# Altium footprint library LC-Standard-FootPrints-AD-V1.00工程师同事给的标准库（含3D）.PcbLib: 463 footprints (part 24 of 29)
Each footprint in its own frame and in the unit in brackets; x right, y up, seen from the top. Pads: shape width x height; smd on the part's side, far side on the other; paste and mask are expansions set on the pad; w line width, h text height; cw(c..) or ccw(c..) is an arc to the next point about the centre after c.
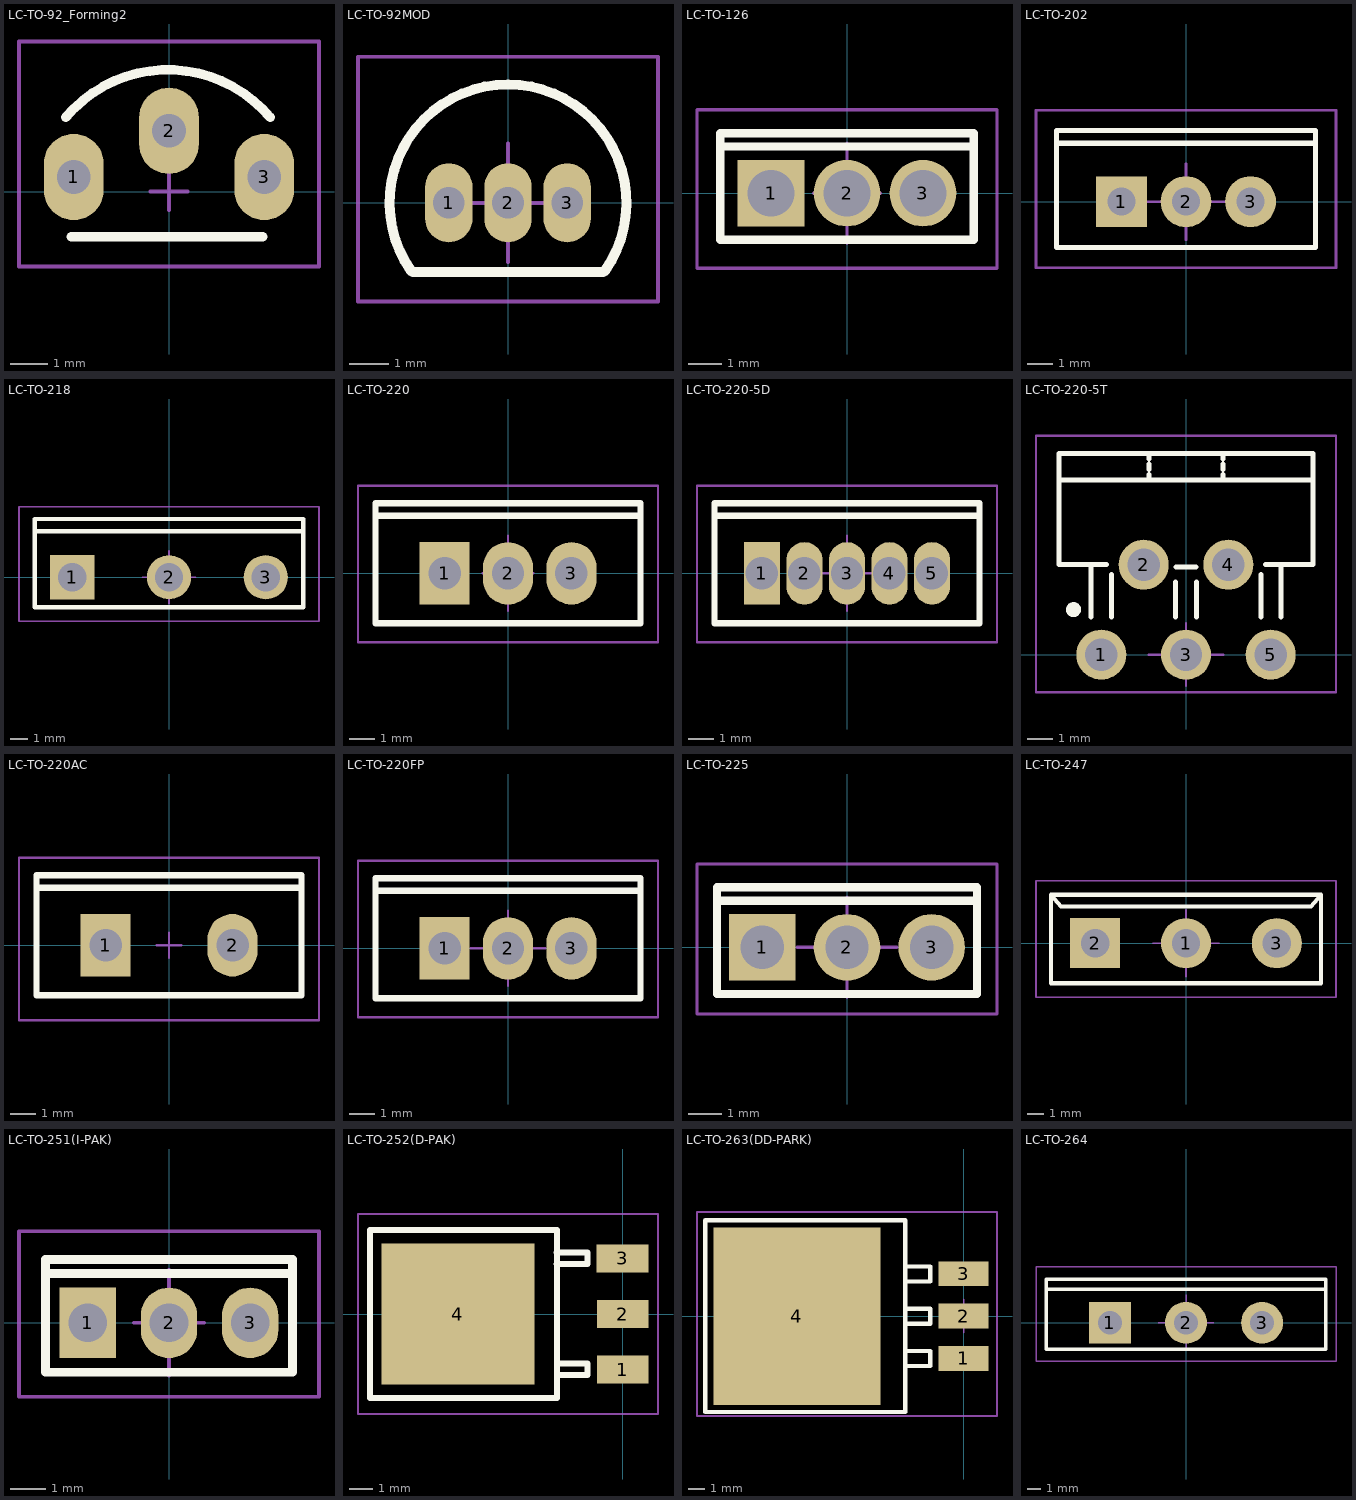
[diagram p23: the footprints below, top view; thin cyan lines are the x and y axes]

## LC-TO-92_Forming2 [mm]
pads (3):
  oval 1.6x2.3 hole 0.9: 1(-2.54,0.387) 2(0,1.619) 3(2.54,0.387)
Top Overlay:
  lines w0.254: -2.753,1.976 cw(c-0.029,-0.31) 2.695,1.976 ; -2.6,-1.2 2.5,-1.2
Mechanical 15:
  lines w0.1: -0.5,0 0.5,0 ; 0,-0.5 0,0.5 ; -4,-2 -4,4 4,4 4,-2 -4,-2
3D body: height 7.14, standoff -0.9, extent -2.84,-1.1 2.84,2.7

## LC-TO-92MOD [mm]
pads (3):
  oval 1.2x2 hole 0.8: 1(-1.5,0) 2(0,0) 3(1.5,0)
Top Overlay:
  lines w0.254: -2.457,-1.721 cw(c0,0) 2.457,-1.721 ; -2.4,-1.75 2.4,-1.75
Mechanical 15:
  lines w0.1: -1,0 1,0 ; 0,-1.5 0,1.5 ; -3.8,-2.5 -3.8,3.7 3.8,3.7 3.8,-2.5 -3.8,-2.5

## LC-TO-126 [mm]
pads (3):
  rect 2x2 hole 1.4: 1(-2.28,0)
  round 2 hole 1.4: 2(0,0) 3(2.28,0)
Top Overlay:
  lines w0.254: -3.8,1.4 3.8,1.4 ; -3.8,-1.4 3.8,-1.4 3.8,1.8 -3.8,1.8 -3.8,-1.4
Mechanical 15:
  lines w0.1: -1,0 1,0 ; 0,-1.5 0,1.5 ; -4.5,-2.25 4.5,-2.25 4.5,2.5 -4.5,2.5 -4.5,-2.25
3D body: height 13.19, standoff -3.54, extent -3.8,-1 3.8,1.55

## LC-TO-202 [mm]
pads (3):
  rect 2x2 hole 1.1: 1(-2.54,0)
  round 2 hole 1.1: 2(0,0) 3(2.54,0)
Top Overlay:
  lines w0.203: -5.1,2.3 5.1,2.3 ; -5.1,-1.8 5.1,-1.8 5.1,2.8 -5.1,2.8 -5.1,-1.8
Mechanical 15:
  lines w0.1: -1.5,0 1.5,0 ; 0,-1.5 0,1.5 ; -5.9,-2.6 5.9,-2.6 5.9,3.6 -5.9,3.6 -5.9,-2.6

## LC-TO-218 [mm]
pads (3):
  rect 2.5x2.5 hole 1.6: 1(-5.48,0)
  round 2.5 hole 1.6: 2(0,0) 3(5.48,0)
Top Overlay:
  lines w0.254: -7.6,2.6 7.6,2.6 ; -7.6,-1.7 -7.6,3.3 7.6,3.3 7.6,-1.7 -7.6,-1.7
Mechanical 15:
  lines w0.1: -1.5,0 1.5,0 ; 0,-1.5 0,1.5 ; -8.5,-2.5 8.5,-2.5 8.5,4 -8.5,4 -8.5,-2.5

## LC-TO-220 [mm]
pads (3):
  rect 2x2.5 hole 1.3: 1(-2.54,0)
  oval 2x2.5 hole 1.3: 2(0,0) 3(2.54,0)
Top Overlay:
  lines w0.254: -5.3,2.3 5.3,2.3 ; -5.3,-2 -5.3,2.8 5.3,2.8 5.3,-2 -5.3,-2
Mechanical 15:
  lines w0.1: -1,0 1,0 ; 0,-1.5 0,1.5 ; -6,-2.75 -6,3.5 6,3.5 6,-2.75 -6,-2.75
3D body: height 19.6, standoff -8.87, extent -5.08,-1.451 5.08,2.9

## LC-TO-220-5D [mm]
pads (5):
  rect 1.45x2.5 hole 1.3: 1(-3.4,0)
  oval 1.45x2.5 hole 1.3: 2(-1.7,0) 3(0,0) 4(1.7,0) 5(3.4,0)
Top Overlay:
  lines w0.254: -5.3,2.3 5.3,2.3 ; -5.3,-2 5.3,-2 5.3,2.8 -5.3,2.8 -5.3,-2
Mechanical 15:
  lines w0.1: -1,0 1,0 ; 0,-1.5 0,1.5 ; -6,-2.75 6,-2.75 6,3.5 -6,3.5 -6,-2.75

## LC-TO-220-5T [mm]
pads (5):
  round 2 hole 1.3: 1(-3.387,0) 2(-1.693,3.598) 3(0,0) 4(1.693,3.598) 5(3.387,0)
Top Overlay:
  circle w0.3: c-4.5,1.8 r0.15
  lines w0.2: -5.08,6.985 5.08,6.985 ; -3.81,1.5 -3.81,3.598 ; -3.187,3.598 -5.08,3.598 -5.08,8.043 5.08,8.043 5.08,3.598 3.187,3.598 ; -2.987,1.5 -2.987,3.2 ; -1.482,6.985 -1.482,7.197 ; -1.482,7.408 -1.482,7.62 ; -1.482,7.832 -1.482,8.043 ; -0.423,1.5 -0.423,2.9 ; 0.423,1.5 0.423,2.9 ; 1.482,6.985 1.482,7.197 ; 1.482,7.408 1.482,7.62 ; 1.482,7.832 1.482,8.043 ; 2.994,1.5 2.994,3.2 ; 3.81,1.5 3.81,3.598
  lines w0.203: -0.4,3.5 0.4,3.5
Mechanical 15:
  lines w0.1: -1.5,0 1.5,0 ; 0,-1.25 0,1.25 ; -6,-1.5 6,-1.5 6,8.75 -6,8.75 -6,-1.5

## LC-TO-220AC [mm]
pads (2):
  rect 2x2.5 hole 1.3: 1(-2.54,0)
  oval 2x2.5 hole 1.3: 2(2.54,0)
Top Overlay:
  lines w0.254: -5.3,2.3 5.3,2.3 ; -5.3,-2 -5.3,2.8 5.3,2.8 5.3,-2 -5.3,-2
Mechanical 15:
  lines w0.1: -0.5,0 0.5,0 ; 0,-0.5 0,0.5 ; -6,-3 6,-3 6,3.5 -6,3.5 -6,-3
3D body: height 19.3, standoff -9.08, extent -4.766,-2.3 4.886,2.2

## LC-TO-220FP [mm]
pads (3):
  rect 2x2.5 hole 1.3: 1(-2.54,0)
  oval 2x2.5 hole 1.3: 2(0,0) 3(2.54,0)
Top Overlay:
  lines w0.254: -5.3,2.3 5.3,2.3 ; -5.3,-2 5.3,-2 5.3,2.8 -5.3,2.8 -5.3,-2
Mechanical 15:
  lines w0.1: -1.5,0 1.5,0 ; 0,-1.5 0,1.5 ; -6,-2.75 -6,3.5 6,3.5 6,-2.75 -6,-2.75
3D body: height 19.37, standoff -9.48, extent -5.07,-1.8 5.07,2.9

## LC-TO-225 [mm]
pads (3):
  rect 2x2 hole 1.3: 1(-2.54,0)
  round 2 hole 1.3: 2(0,0) 3(2.54,0)
Top Overlay:
  lines w0.254: -3.9,1.4 3.9,1.4 ; -3.9,-1.4 3.9,-1.4 3.9,1.8 -3.9,1.8 -3.9,-1.4
Mechanical 15:
  lines w0.1: -1.5,0 1.5,0 ; 0,-1.5 0,1.5 ; -4.5,-2 4.5,-2 4.5,2.5 -4.5,2.5 -4.5,-2

## LC-TO-247 [mm]
pads (3):
  round 3 hole 1.7: 1(0,0) 3(5.45,0)
  rect 3x3 hole 1.7: 2(-5.45,0)
Top Overlay:
  lines w0.254: -8.1,2.9 8.1,2.9 ; -8.1,2.9 -8.1,-2.4 8.1,-2.4 8.1,2.9 ; -8.1,2.9 -7.5,2.2 7.5,2.2 8.1,2.9
Mechanical 15:
  lines w0.1: -2,0 2,0 ; 0,-2 0,2 ; -9,-3.25 -9,3.75 9,3.75 9,-3.25 -9,-3.25
3D body: height 26.35, standoff -15.05, extent -8,-2.2 8,2.8

## LC-TO-251(I-PAK) [mm]
pads (3):
  rect 1.6x2 hole 1.1: 1(-2.3,0)
  oval 1.6x2 hole 1.1: 2(0,0) 3(2.3,0)
Top Overlay:
  lines w0.254: -3.5,1.4 -3.5,1.8 3.5,1.8 3.5,1.4 ; -3.5,1.4 -3.5,-1.4 3.5,-1.4 3.5,1.4 ; -3.5,1.4 3.5,1.4
Mechanical 15:
  lines w0.1: -1,0 1,0 ; 0,-1.5 0,1.5 ; -4.25,-2.1 -4.25,2.6 4.25,2.6 4.25,-2.1 -4.25,-2.1
3D body: height 9.46, standoff -3.92, extent -3.3,-0.9 3.3,1.4

## LC-TO-252(D-PAK) [mm]
pads (4):
  rect 2.2x1.2 smd: 1(0,-2.361) 2(0,0) 3(-0.004,2.361)
  rect 6.5x6 smd: 4(-7,0)
Top Overlay:
  lines w0.254: -2.804,2.123 -1.504,2.123 -1.504,2.623 -2.804,2.623 -2.8,2.618 ; -2.8,-2.6 -1.5,-2.6 -1.5,-2.1 -2.8,-2.1 ; -10.75,-3.573 -10.75,3.573 -2.8,3.573 -2.8,-3.573 -10.75,-3.573
Mechanical 15:
  lines w0.1: -0.5,0 0.5,0 ; 0,-0.5 0,0.5 ; -11.25,-4.25 1.5,-4.25 1.5,4.25 -11.25,4.25 -11.25,-4.25
3D body: height 2.44, standoff 0.03, extent -9.738,-3.27 0.2,3.27

## LC-TO-263(DD-PARK) [mm]
pads (4):
  rect 3x1.5 smd: 1(0,-2.54) 2(0,0) 3(0,2.54)
  rect 10x10.66 smd: 4(-10,0)
Top Overlay:
  lines w0.254: -3.5,-3 -2,-3 -2,-2.1 -3.5,-2.1 ; -3.5,-0.46 -2,-0.46 -2,0.44 -3.5,0.44 ; -3.5,2.08 -2,2.08 -2,2.98 -3.5,2.98 ; -15.5,-5.75 -3.5,-5.75 -3.5,5.75 -15.5,5.75 -15.5,-5.75
Mechanical 15:
  lines w0.1: -0.5,0 0.5,0 ; 0,-1 0,1 ; -16,-6 2,-6 2,6.25 -16,6.25 -16,-6
3D body: height 4.87, standoff 0, extent -13.73,-5.08 0.5,5.08

## LC-TO-264 [mm]
pads (3):
  rect 3x3 hole 1.7: 1(-5.45,0)
  round 3 hole 1.7: 2(0,0) 3(5.45,0)
Top Overlay:
  lines w0.254: -10,2.4 10,2.4 ; -10,-1.9 10,-1.9 10,3.1 -10,3.1 -10,-1.9
Mechanical 15:
  lines w0.1: -2,0 2,0 ; 0,-2 0,2 ; -10.75,-2.75 10.75,-2.75 10.75,4 -10.75,4 -10.75,-2.75